# Altium footprint library YS_PCBLIB.PcbLib: 133 footprints (part 7 of 9)
Each footprint in its own frame and in the unit in brackets; x right, y up, seen from the top. Pads: shape width x height; smd on the part's side, far side on the other; paste and mask are expansions set on the pad; w line width, h text height; cw(c..) or ccw(c..) is an arc to the next point about the centre after c.
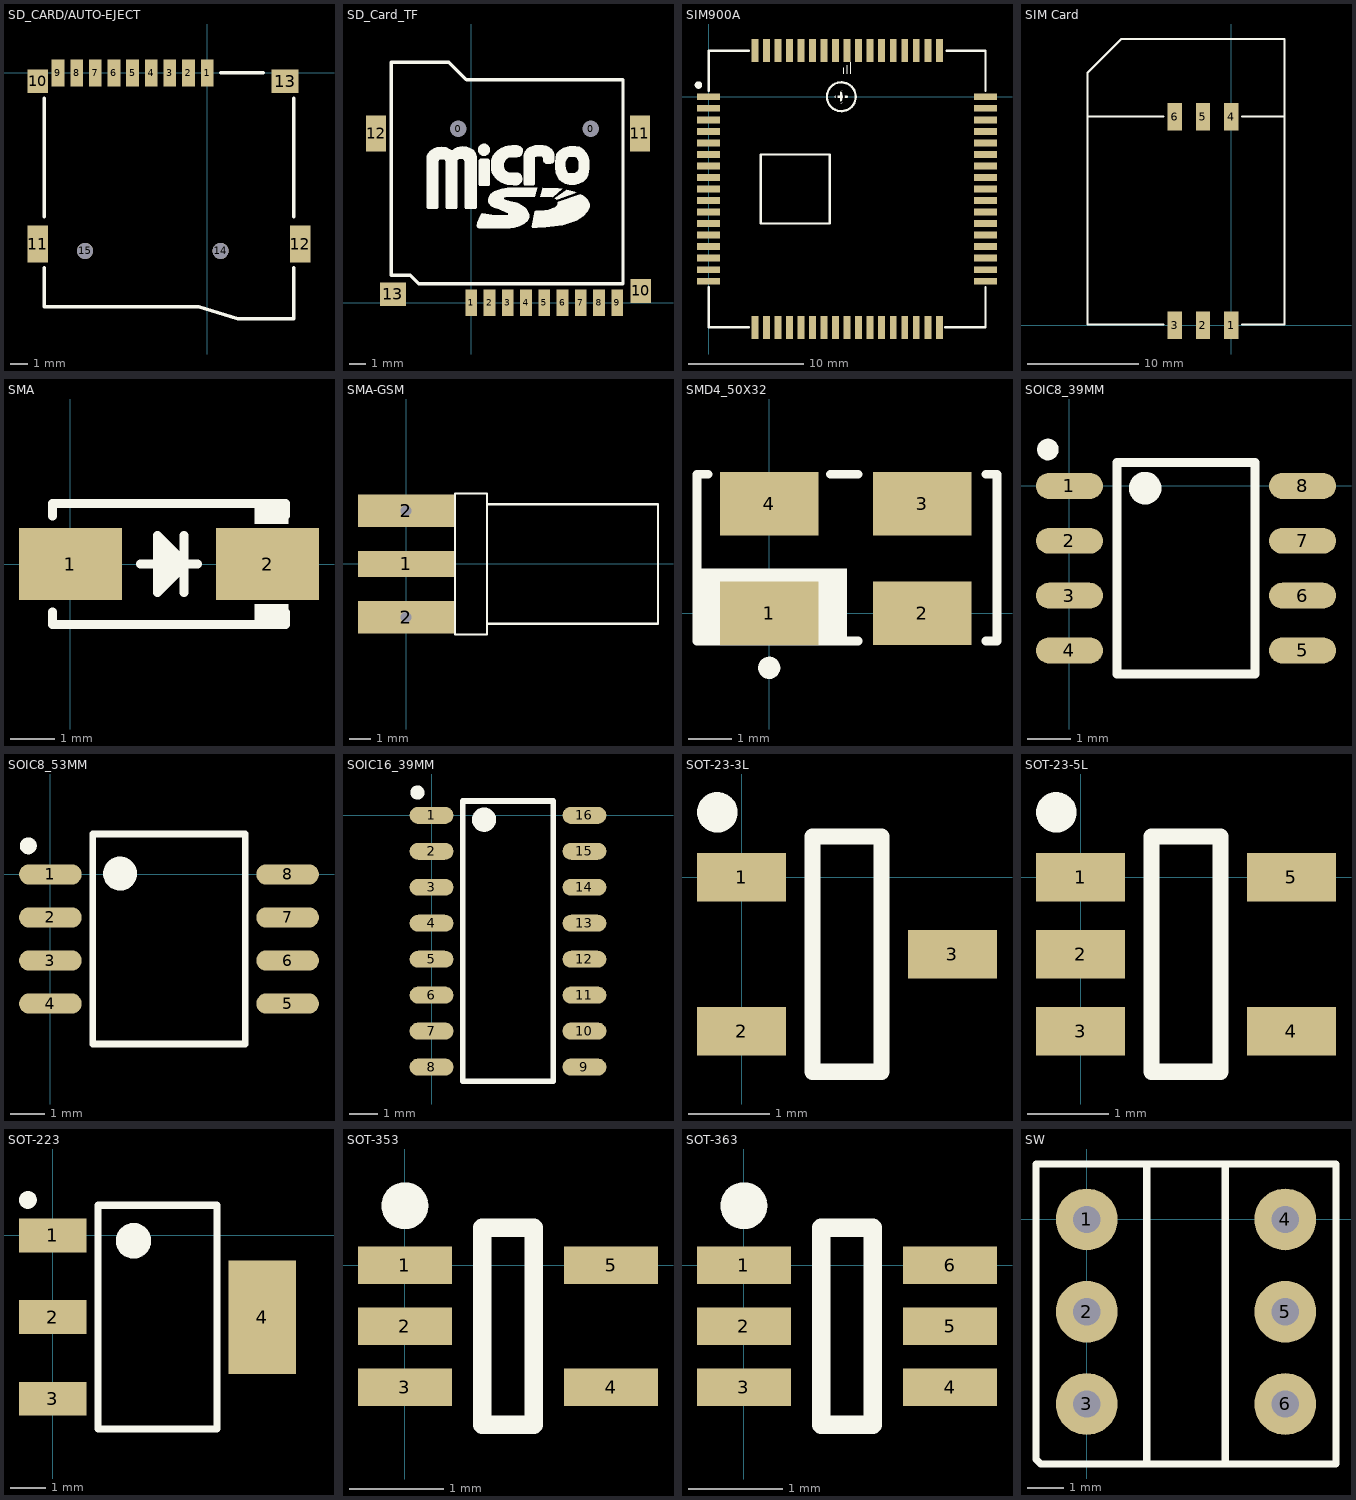
[diagram p6: the footprints below, top view; thin cyan lines are the x and y axes]

## SD_CARD/AUTO-EJECT [mm]
pads (15):
  rect 0.75x1.6 smd: 1(0,0) 2(-1.1,0) 3(-2.2,0) 4(-3.3,0) 5(-4.4,0) 6(-5.5,0) 7(-6.6,0) 8(-7.7,0) 9(-8.8,0)
  rect 1.2x1.4 smd: 10(-10,-0.5)
  rect 1.2x2.2 smd: 11(-10,-10.1) 12(5.5,-10.1)
  rect 1.6x1.4 smd: 13(4.6,-0.5)
  round 0.95 hole 0.95 unplated: 14(0.8,-10.5) 15(-7.2,-10.5)
Top Overlay:
  lines w0.2: -9.6,-11.5 -9.6,-13.8 -0.5,-13.8 1.8,-14.5 5.1,-14.5 5.1,-11.5 ; -9.6,-8.5 -9.6,-1.5 ; 0.8,0 3.3,0 ; 5.1,-8.5 5.1,-1.5

## SD_Card_TF [mil]
pads (15):
  round 30 hole 39.37 mask+0: 0(-31.5,413.39) 0(283.46,413.39)
  rect 28x62 smd: 1(0,0) 2(43.31,0) 3(86.61,0) 4(129.92,0) 5(173.23,0) 6(216.54,0) 7(259.84,0) 8(303.15,0) 9(346.46,0)
  rect 48x56 smd: 10(402,28)
  rect 48x86 smd: 11(400,402) 12(-226,402)
  rect 62x56 smd: 13(-186,20)
Top Overlay:
  drawing of 18 lines, arcs and shapes, not listed

## SIM900A [mm]
pads (69):
  round 2.54 on Top Solder: 0(11.506,0)
  rect 2x0.6 smd: 1(0,0) 2(0,-1) 3(0,-2) 4(0,-3) 5(0,-4) 6(0,-5) 7(0,-6) 8(0,-7) 9(0,-8) 10(0,-9) 11(0,-10) 12(0,-11) 13(0,-12) 14(0,-13) 15(0,-14) 16(0,-15) 17(0,-16) 35(24,-16) 36(24,-15) 37(24,-14) 38(24,-13) 39(24,-12) 40(24,-11) 41(24,-10) 42(24,-9) 43(24,-8) 44(24,-7) 45(24,-6) 46(24,-5) 47(24,-4) 48(24,-3) 49(24,-2) 50(24,-1) 51(24,0)
  rect 0.6x2 smd: 18(4,-20) 19(5,-20) 20(6,-20) 21(7,-20) 22(8,-20) 23(9,-20) 24(10,-20) 25(11,-20) 26(12,-20) 27(13,-20) 28(14,-20) 29(15,-20) 30(16,-20) 31(17,-20) 32(18,-20) 33(19,-20) 34(20,-20) 52(20,4) 53(19,4) 54(18,4) 55(17,4) 56(16,4) 57(15,4) 58(14,4) 59(13,4) 60(12,4) 61(11,4) 62(10,4) 63(9,4) 64(8,4) 65(7,4) 66(6,4) 67(5,4) 68(4,4)
Top Overlay:
  circle w0.2: c11.5,0 r1.25
  circle w0.4: c-0.889,1.016 r0.127
  lines w0.1: 11.7,2 11.7,2.5 ; 12,2 12,2.75 ; 12.3,2 12.3,3
  lines w0.2: 0,-16.51 0,-20 3.495,-20 ; 0,0.508 0,4 3.493,4 ; 11,0 12,0 ; 11.5,-0.5 11.5,0.5 ; 20.508,-20 24,-20 24,-16.513 ; 20.637,4 24,4 24,0.511 ; 4.5,-11 10.5,-11 10.5,-5 4.5,-5 4.5,-11
Top Solder:
  rectangle: 4.496,-10.998 10.49,-5.029

## SIM Card [mm]
pads (6):
  rect 1.3x2.5 smd: 1(0,0) 2(-2.55,0) 3(-5.1,0) 4(0,18.806) 5(-2.55,18.806) 6(-5.1,18.806)
Top Overlay:
  lines w0.2: -12.974,17.83 -12.974,21.767 ; -12.974,18.846 -6.116,18.846 ; -12.974,22.021 -12.974,22.783 -9.926,25.831 -7.64,25.831 ; -12.974,22.436 -12.974,0.056 -6.122,0.056 ; -8.275,25.831 4.795,25.831 ; 0.996,18.846 4.806,18.846 ; 1.002,0.056 4.806,0.056 4.806,25.831

## SMA [mm]
pads (2):
  rect 2.3x1.6 smd: 1(0,0) 2(4.4,0)
Top Overlay:
  rectangle: 4.105,-1.35 4.867,-0.889
  rectangle: 4.105,0.889 4.867,1.35
  region: 1.946,0.635 1.946,-0.635 2.581,0
  lines w0.2: -0.4,-1.076 -0.4,-1.35 4.8,-1.35 4.8,-1.083 ; -0.4,1.076 -0.4,1.35 4.8,1.35 4.8,1.083 ; 1.565,0 2.835,0 ; 2.54,-0.635 2.54,0.635 ; 1.946,-0.635 1.946,0.635 2.581,0 1.946,-0.635

## SMA-GSM [mm]
pads (3):
  rect 4.5x1.2 smd: 1(0,0)
  rect 4.5x1.524 hole 0.5: 2(0,-2.5) 2(0,2.5)
Top Overlay:
  lines w0.1: 3.8,-2.8 11.8,-2.8 11.8,2.8 3.8,2.8 ; 2.3,-3.3 3.8,-3.3 3.8,3.3 2.3,3.3 2.3,-3.3

## SMD4_50X32 [mm]
pads (4):
  rect 2.25x1.45 smd: 1(0,0) 2(3.5,0) 3(3.5,2.5) 4(0,2.5)
Top Overlay:
  circle w0.25: c0,-1.25 r0.129
  rectangle: -1.651,-0.737 1.778,1.016
  lines w0.203: -1.397,-0.635 -1.651,-0.635 -1.651,3.175 -1.397,3.175 ; 1.397,-0.635 2.032,-0.635 ; 1.397,3.175 2.032,3.175 ; 4.953,-0.635 5.207,-0.635 5.207,3.175 4.953,3.175

## SOIC8_39MM [mm]
pads (8):
  oval 1.55x0.6 smd: 1(0,0) 2(0,-1.27) 3(0,-2.54) 4(0,-3.81) 5(5.4,-3.81) 6(5.4,-2.54) 7(5.4,-1.27) 8(5.4,0)
Top Overlay:
  circle w0.25: c-0.5,0.845 r0.125
  circle w0.5: c1.753,-0.051 r0.127
  lines w0.2: 1.1,-4.355 1.1,0.545 4.3,0.545 4.3,-4.355 1.1,-4.355

## SOIC8_53MM [mm]
pads (8):
  oval 1.85x0.6 smd: 1(0,0) 2(0,-1.27) 3(0,-2.54) 4(0,-3.81) 5(7,-3.81) 6(7,-2.54) 7(7,-1.27) 8(7,0)
Top Overlay:
  circle w0.5: c2.057,0.025 r0.25
  circle w0.25: c-0.65,0.845 r0.125
  lines w0.2: 1.25,-5.005 5.75,-5.005 5.75,1.195 1.25,1.195 1.25,-5.005

## SOIC16_39MM [mm]
pads (16):
  oval 1.55x0.6 smd: 1(0,0) 2(0,-1.27) 3(0,-2.54) 4(0,-3.81) 5(0,-5.08) 6(0,-6.35) 7(0,-7.62) 8(0,-8.89) 9(5.4,-8.89) 10(5.4,-7.62) 11(5.4,-6.35) 12(5.4,-5.08) 13(5.4,-3.81) 14(5.4,-2.54) 15(5.4,-1.27) 16(5.4,0)
Top Overlay:
  circle w0.25: c-0.5,0.805 r0.125
  circle w0.5: c1.854,-0.152 r0.178
  lines w0.2: 1.1,-9.395 1.1,0.505 4.3,0.505 4.3,-9.395 1.1,-9.395

## SOT-23-3L [mm]
pads (3):
  rect 1.1x0.6 smd: 1(0,0) 2(0,-1.9) 3(2.6,-0.95)
Top Overlay:
  circle w0.25: c-0.3,0.8 r0.125
  lines w0.2: 0.875,-2.4 1.725,-2.4 1.725,0.5 0.875,0.5 0.875,-2.4

## SOT-23-5L [mm]
pads (5):
  rect 1.1x0.6 smd: 1(0,0) 2(0,-0.95) 3(0,-1.9) 4(2.6,-1.9) 5(2.6,0)
Top Overlay:
  circle w0.25: c-0.3,0.8 r0.125
  lines w0.2: 0.875,-2.4 0.875,0.5 1.725,0.5 1.725,-2.4 0.875,-2.4

## SOT-223 [mm]
pads (4):
  rect 1.9x0.95 smd: 1(0,0) 2(0,-2.3) 3(0,-4.6)
  rect 1.9x3.2 smd: 4(5.9,-2.3)
Top Overlay:
  circle w0.25: c-0.7,1 r0.125
  circle w0.5: c2.275,-0.15 r0.25
  lines w0.2: 1.275,-5.45 1.275,0.85 4.625,0.85 4.625,-5.45 1.275,-5.45

## SOT-353 [mm]
pads (5):
  rect 1x0.4 smd: 1(0,0) 2(0,-0.65) 3(0,-1.3) 4(2.2,-1.3) 5(2.2,0)
Top Overlay:
  circle w0.25: c0,0.635 r0.125
  lines w0.2: 0.825,-1.7 1.375,-1.7 1.375,0.4 0.825,0.4 0.825,-1.7

## SOT-363 [mm]
pads (6):
  rect 1x0.4 smd: 1(0,0) 2(0,-0.65) 3(0,-1.3) 4(2.2,-1.3) 5(2.2,-0.65) 6(2.2,0)
Top Overlay:
  circle w0.25: c0,0.635 r0.125
  lines w0.2: 0.825,-1.7 0.825,0.4 1.375,0.4 1.375,-1.7 0.825,-1.7

## SW [mm]
pads (6):
  round 1.7 hole 0.75: 1(0,0) 2(0,-2.54) 3(0,-5.08) 4(5.461,0) 5(5.461,-2.54) 6(5.461,-5.08)
Top Overlay:
  lines w0.2: 1.651,-6.731 1.651,1.524 ; 3.81,-6.731 3.81,1.524 ; -1.397,-6.604 -1.27,-6.731 6.858,-6.731 6.858,1.524 -1.397,1.524 -1.397,0 -1.397,-6.604